# Altium footprint library ic.PcbLib: 68 footprints (part 3 of 5)
Each footprint in its own frame and in the unit in brackets; x right, y up, seen from the top. Pads: shape width x height; smd on the part's side, far side on the other; paste and mask are expansions set on the pad; w line width, h text height; cw(c..) or ccw(c..) is an arc to the next point about the centre after c.
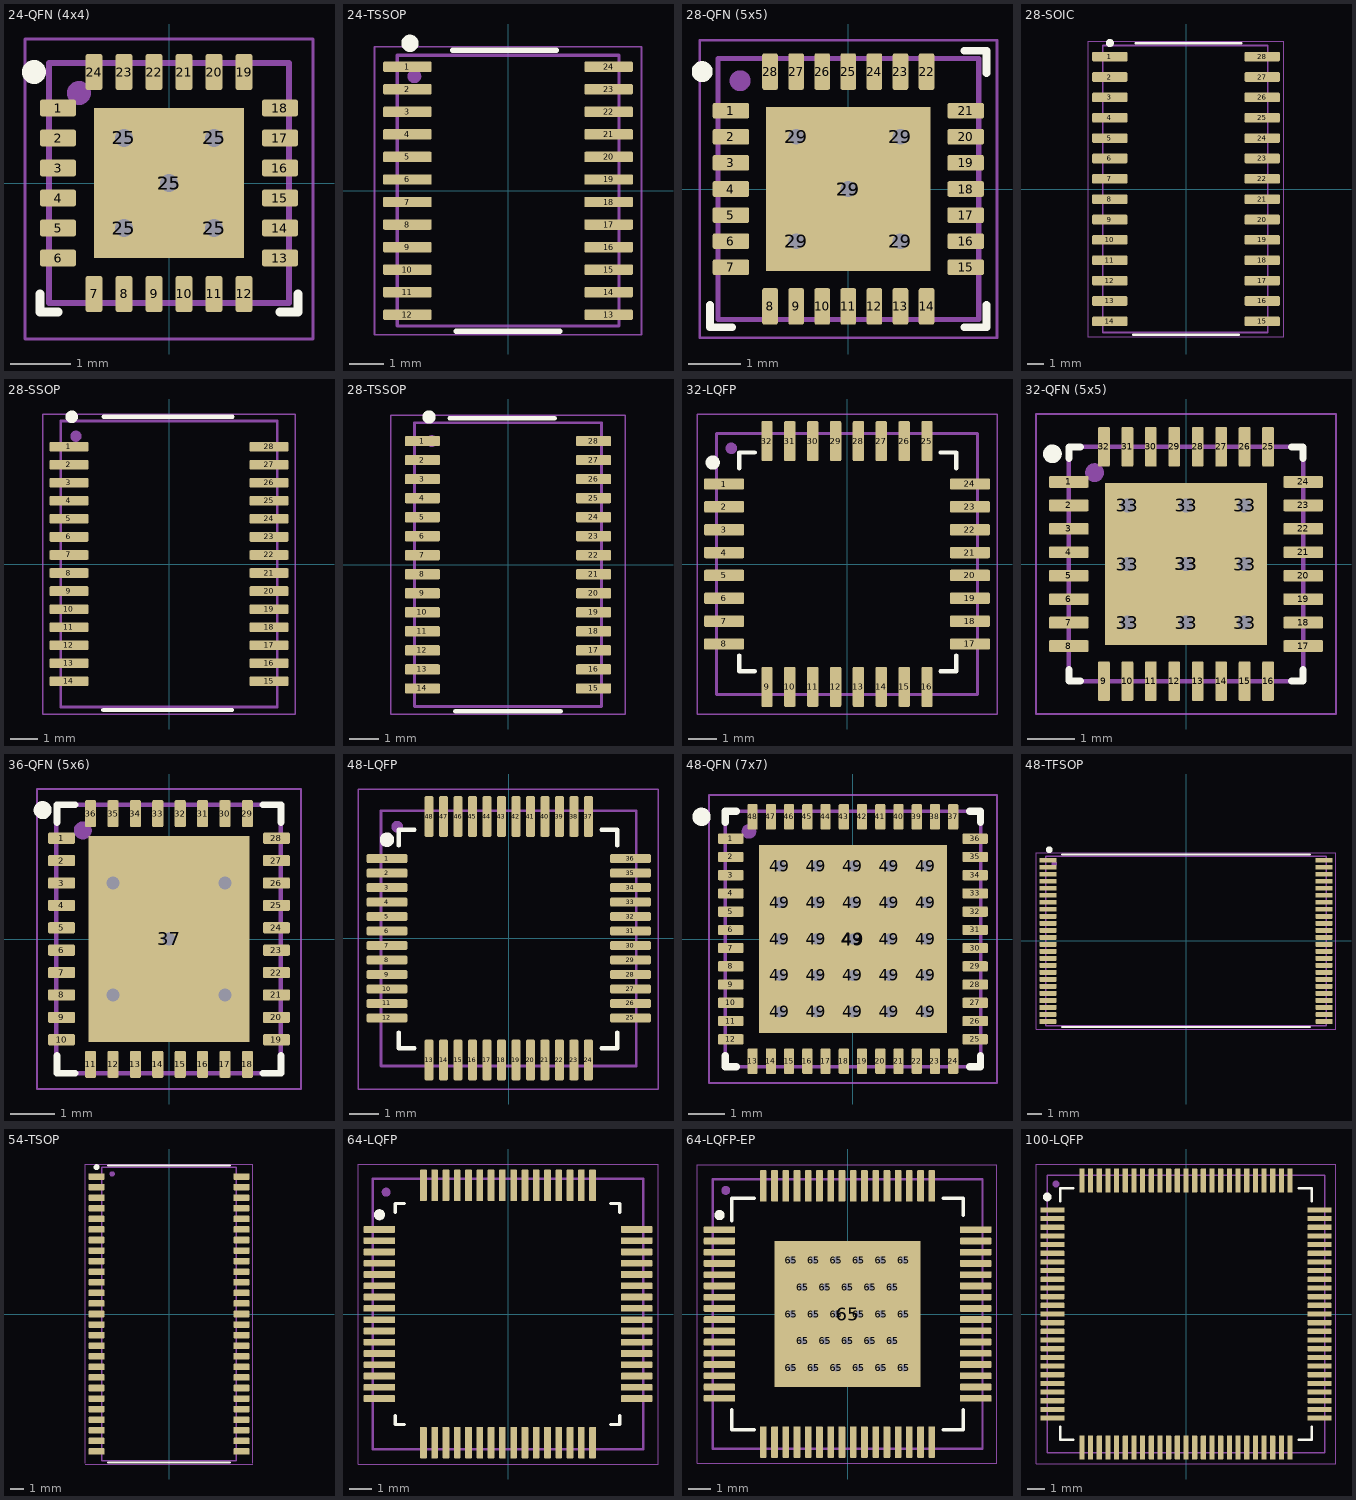
[diagram p2: the footprints below, top view; thin cyan lines are the x and y axes]

## 24-QFN (4x4) [mm]
height 0.75
pads (30):
  rrect25% 0.6x0.28 smd: 1(-1.85,1.25) 2(-1.85,0.75) 3(-1.85,0.25) 4(-1.85,-0.25) 5(-1.85,-0.75) 6(-1.85,-1.25) 13(1.85,-1.25) 14(1.85,-0.75) 15(1.85,-0.25) 16(1.85,0.25) 17(1.85,0.75) 18(1.85,1.25)
  rrect25% 0.28x0.6 smd: 7(-1.25,-1.85) 8(-0.75,-1.85) 9(-0.25,-1.85) 10(0.25,-1.85) 11(0.75,-1.85) 12(1.25,-1.85) 19(1.25,1.85) 20(0.75,1.85) 21(0.25,1.85) 22(-0.25,1.85) 23(-0.75,1.85) 24(-1.25,1.85)
  round 0.6 hole 0.3: 25(-0.75,-0.75) 25(-0.75,0.75) 25(0,0) 25(0.75,-0.75) 25(0.75,0.75)
  rect 2.5x2.5 smd: 25(0,0)
Top Overlay:
  circle w0.2: c-2.25,1.85 r0.1
  lines w0.15: -2.15,-1.85 -2.15,-2.15 -1.85,-2.15 ; 1.85,-2.15 2.15,-2.15 2.15,-1.85
Top Assy:
  circle w0.2: c-1.5,1.5 r0.1
  lines w0.1: -2,-2 -2,2 2,2 2,-2 -2,-2
  text ".Designator" at 0,0 h1
Top Cortyard:
  lines w0.05: -2.4,-2.6 -2.4,2.4 2.4,2.4 2.4,-2.6 -2.4,-2.6
  lines w0.1: -0.5,0 0.5,0 ; 0,-0.5 0,0.5
3D body "24-QFN (4x4 mm).step": height 0.75, standoff 0, extent -2,-2 2,2

## 24-TSSOP [mm]
height 1.2
pads (24):
  rrect25% 1.4x0.3 smd: 1(-2.9,3.575) 2(-2.9,2.925) 3(-2.9,2.275) 4(-2.9,1.625) 5(-2.9,0.975) 6(-2.9,0.325) 7(-2.9,-0.325) 8(-2.9,-0.975) 9(-2.9,-1.625) 10(-2.9,-2.275) 11(-2.9,-2.925) 12(-2.9,-3.575) 13(2.9,-3.575) 14(2.9,-2.925) 15(2.9,-2.275) 16(2.9,-1.625) 17(2.9,-0.975) 18(2.9,-0.325) 19(2.9,0.325) 20(2.9,0.975) 21(2.9,1.625) 22(2.9,2.275) 23(2.9,2.925) 24(2.9,3.575)
Top Overlay:
  circle w0.25: c-2.825,4.25 r0.125
  lines w0.15: -1.6,4.05 1.4,4.05 ; -1.5,-4.05 1.5,-4.05
Top Assy:
  lines w0.1: -3.2,-3.9 -3.2,3.9 3.2,3.9 3.2,-3.9 -3.2,-3.9
  lines w0.2: -2.605,3.332 ccw(c-2.7,3.3) -2.6,3.3
  text ".Designator" at 0,0 h1
Top Cortyard:
  lines w0.05: -3.85,-4.15 -3.85,4.15 3.85,4.15 3.85,-4.15 -3.85,-4.15
3D body "TSSOP24.STEP": height 1.2, standoff 0, extent -3.2,-3.9 3.2,3.9

## 28-QFN (5x5) [mm] "PQFN, 28-Leads, Body 5,00x5,00mm, Pitch 0,50mm, Thermal Pad 3,15x3,15mm, IPC Medium Density"
height 0.9
pads (34):
  rrect25% 0.7x0.3 smd: 1(-2.25,1.5) 2(-2.25,1) 3(-2.25,0.5) 4(-2.25,0) 5(-2.25,-0.5) 6(-2.25,-1) 7(-2.25,-1.5) 15(2.25,-1.5) 16(2.25,-1) 17(2.25,-0.5) 18(2.25,0) 19(2.25,0.5) 20(2.25,1) 21(2.25,1.5)
  rrect25% 0.3x0.7 smd: 8(-1.5,-2.25) 9(-1,-2.25) 10(-0.5,-2.25) 11(0,-2.25) 12(0.5,-2.25) 13(1,-2.25) 14(1.5,-2.25) 22(1.5,2.25) 23(1,2.25) 24(0.5,2.25) 25(0,2.25) 26(-0.5,2.25) 27(-1,2.25) 28(-1.5,2.25)
  round 0.6 hole 0.3: 29(-1,-1) 29(-1,1) 29(0,0) 29(1,-1) 29(1,1)
  rect 3.15x3.15 smd: 29(0,0)
Top Overlay:
  circle w0.2: c-2.8,2.25 r0.1
  lines w0.15: -2.65,-2.225 -2.65,-2.65 -2.225,-2.65 ; 2.225,-2.65 2.65,-2.65 2.65,-2.225 ; 2.225,2.65 2.65,2.65 2.65,2.225
Top Assy:
  circle w0.2: c-2.075,2.075 r0.1
  lines w0.1: -2.5,-2.5 -2.5,2.5 2.5,2.5 2.5,-2.5 -2.5,-2.5
  text ".Designator" at 0,0 h1
Top Cortyard:
  lines w0.05: -2.85,-2.85 2.85,-2.85 2.85,2.85 -2.85,2.85 -2.85,-2.85
3D body "28-QFN, 0.5 mm.step": height 0.9, standoff 0, extent -2.5,-2.5 2.5,2.5

## 28-SOIC [mm] "SOIC, 28-Leads, Body 17,86x7,46mm, Pitch 1,27mm, IPC Medium Density"
height 2.65
pads (28):
  rrect25% 2.2x0.6 smd: 1(-4.75,8.255) 2(-4.75,6.985) 3(-4.75,5.715) 4(-4.75,4.445) 5(-4.75,3.175) 6(-4.75,1.905) 7(-4.75,0.635) 8(-4.75,-0.635) 9(-4.75,-1.905) 10(-4.75,-3.175) 11(-4.75,-4.445) 12(-4.75,-5.715) 13(-4.75,-6.985) 14(-4.75,-8.255) 15(4.75,-8.255) 16(4.75,-6.985) 17(4.75,-5.715) 18(4.75,-4.445) 19(4.75,-3.175) 20(4.75,-1.905) 21(4.75,-0.635) 22(4.75,0.635) 23(4.75,1.905) 24(4.75,3.175) 25(4.75,4.445) 26(4.75,5.715) 27(4.75,6.985) 28(4.75,8.255)
Top Overlay:
  circle w0.25: c-4.75,9.105 r0.125
  lines w0.15: -3.3,-9.1 3.3,-9.1 ; -3.15,9.1 3.45,9.1
Top Assy:
  lines w0.1: -5.2,-8.95 -5.2,8.95 5.1,8.95 5.1,-8.95 -5.2,-8.95
  lines w0.2: -4.527,8.277 ccw(c-4.625,8.255) -4.526,8.267
  text ".Designator" at 0,0 h1
Top Cortyard:
  lines w0.05: -6.1,-9.25 -6.1,9.2 6.1,9.2 6.1,-9.25 ; -6.1,-9.2 6.1,-9.2
3D body "User Library-28-SOIC.STEP": height 2.73, standoff -0.03, extent -5.2,-8.95 5.1,8.95

## 28-SSOP [mm]
pads (28):
  rrect25% 1.4x0.35 smd: 1(-3.6,4.225) 2(-3.6,3.575) 3(-3.6,2.925) 4(-3.6,2.275) 5(-3.6,1.625) 6(-3.6,0.975) 7(-3.6,0.325) 8(-3.6,-0.325) 9(-3.6,-0.975) 10(-3.6,-1.625) 11(-3.6,-2.275) 12(-3.6,-2.925) 13(-3.6,-3.575) 14(-3.6,-4.225) 15(3.6,-4.225) 16(3.6,-3.575) 17(3.6,-2.925) 18(3.6,-2.275) 19(3.6,-1.625) 20(3.6,-0.975) 21(3.6,-0.325) 22(3.6,0.325) 23(3.6,0.975) 24(3.6,1.625) 25(3.6,2.275) 26(3.6,2.925) 27(3.6,3.575) 28(3.6,4.225)
Top Overlay:
  circle w0.254: c-3.5,5.3 r0.1
  lines w0.15: -2.365,-5.25 2.265,-5.25 ; -2.35,5.3 2.28,5.3
Top Assy:
  lines w0.1: -3.9,-5.15 3.9,-5.15 3.9,5.15 -3.9,5.15 -3.9,-5.15
  lines w0.2: -3.255,4.568 cw(c-3.35,4.6) -3.25,4.6
  text ".Designator" at 0,0 h1
Top Cortyard:
  lines w0.05: -4.55,-5.4 -4.55,5.4 4.55,5.4 4.55,-5.4 -4.55,-5.4
3D body "User Library-SSOP-28-1.STEP": height 2.15, standoff 0, extent -3.878,-5.165 3.878,5.165

## 28-TSSOP [mm] "SOP, 28-Leads, Body 9,70x4,40mm, Pitch 0,65mm, IPC Medium Density"
height 2.65
pads (28):
  rrect25% 1.2x0.35 smd: 1(-2.925,4.225) 2(-2.925,3.575) 3(-2.925,2.925) 4(-2.925,2.275) 5(-2.925,1.625) 6(-2.925,0.975) 7(-2.925,0.325) 8(-2.925,-0.325) 9(-2.925,-0.975) 10(-2.925,-1.625) 11(-2.925,-2.275) 12(-2.925,-2.925) 13(-2.925,-3.575) 14(-2.925,-4.225) 15(2.925,-4.225) 16(2.925,-3.575) 17(2.925,-2.925) 18(2.925,-2.275) 19(2.925,-1.625) 20(2.925,-0.975) 21(2.925,-0.325) 22(2.925,0.325) 23(2.925,0.975) 24(2.925,1.625) 25(2.925,2.275) 26(2.925,2.925) 27(2.925,3.575) 28(2.925,4.225)
Top Overlay:
  lines w0.15: -2,5 1.6,5 ; -1.8,-5 1.8,-5
  lines w0.254: -2.603,5.026 cw(c-2.7,5.05) -2.6,5.05
Top Assy:
  lines w0.1: -3.2,-4.85 3.2,-4.85 3.2,4.85 -3.2,4.85 -3.2,-4.85
  lines w0.2: -2.503,4.225 cw(c-2.603,4.225) -2.503,4.233
  text ".Designator" at 0,0 h1
Top Cortyard:
  lines w0.05: -4,-5.1 4,-5.1 4,5.1 -4,5.1 -4,-5.1
3D body "User Library-TSSOP-28.STEP": height 1.2, standoff 0, extent -3.2,-4.85 3.2,4.85

## 32-LQFP [mm] "Generic LQFP-32 case"
height 1.6
pads (32):
  rrect25% 1.4x0.4 smd: 1(-4.3,2.8) 2(-4.3,2) 3(-4.3,1.2) 4(-4.3,0.4) 5(-4.3,-0.4) 6(-4.3,-1.2) 7(-4.3,-2) 8(-4.3,-2.8) 17(4.3,-2.8) 18(4.3,-2) 19(4.3,-1.2) 20(4.3,-0.4) 21(4.3,0.4) 22(4.3,1.2) 23(4.3,2) 24(4.3,2.8)
  rrect25% 0.4x1.4 smd: 9(-2.8,-4.3) 10(-2,-4.3) 11(-1.2,-4.3) 12(-0.4,-4.3) 13(0.4,-4.3) 14(1.2,-4.3) 15(2,-4.3) 16(2.8,-4.3) 25(2.8,4.3) 26(2,4.3) 27(1.2,4.3) 28(0.4,4.3) 29(-0.4,4.3) 30(-1.2,4.3) 31(-2,4.3) 32(-2.8,4.3)
Top Overlay:
  circle w0.25: c-4.7,3.55 r0.125
  lines w0.15: -3.775,-3.2 -3.775,-3.75 -3.225,-3.75 ; -3.775,3.35 -3.775,3.9 -3.225,3.9 ; 3.275,-3.75 3.825,-3.75 3.825,-3.2 ; 3.275,3.9 3.825,3.9 3.825,3.35
Top Assy:
  circle w0.2: c-4.05,4.05 r0.1
  lines w0.1: -4.572,-4.572 4.572,-4.572 4.572,4.572 -4.572,4.572 -4.572,-4.572
  text ".Designator" at 0,0 h1
Top Cortyard:
  lines w0.05: -5.25,-5.25 -5.25,5.25 5.25,5.25 5.25,-5.25 -5.25,-5.25
3D body "User Library-LQFP32-2.STEP": height 1.62, standoff -0.01, extent -4.572,-4.572 4.572,4.572

## 32-QFN (5x5) [mm] "QFN, 32-Leads, Body 5x5mm, Pitch 0.5mm, Thermal Pad 3.45x3.45mm, TI Recommended"
height 1
pads (42):
  rrect25% 0.85x0.25 smd paste-0.025 mask+0.07: 1(-2.5,1.75) 2(-2.5,1.25) 3(-2.5,0.75) 4(-2.5,0.25) 5(-2.5,-0.25) 6(-2.5,-0.75) 7(-2.5,-1.25) 8(-2.5,-1.75) 17(2.5,-1.75) 18(2.5,-1.25) 19(2.5,-0.75) 20(2.5,-0.25) 21(2.5,0.25) 22(2.5,0.75) 23(2.5,1.25) 24(2.5,1.75)
  rrect25% 0.25x0.85 smd paste-0.025 mask+0.07: 9(-1.75,-2.5) 10(-1.25,-2.5) 11(-0.75,-2.5) 12(-0.25,-2.5) 13(0.25,-2.5) 14(0.75,-2.5) 15(1.25,-2.5) 16(1.75,-2.5) 25(1.75,2.5) 26(1.25,2.5) 27(0.75,2.5) 28(0.25,2.5) 29(-0.25,2.5) 30(-0.75,2.5) 31(-1.25,2.5) 32(-1.75,2.5)
  round 0.6 hole 0.3: 33(-1.25,-1.25) 33(-1.25,0) 33(-1.25,1.25) 33(0,-1.25) 33(0,0) 33(0,1.25) 33(1.25,-1.25) 33(1.25,0) 33(1.25,1.25)
  rect 3.45x3.45 smd paste-1.725 mask+0.07: 33(0,0)
Top Overlay:
  circle w0.2: c-2.85,2.35 r0.1
  lines w0.15: -2.5,-2.25 -2.5,-2.5 -2.25,-2.5 ; -2.5,2.25 -2.5,2.5 -2.25,2.5 ; 2.25,-2.5 2.5,-2.5 2.5,-2.25 ; 2.25,2.5 2.5,2.5 2.5,2.25
Top Paste:
  region: -0.15,1.6 -1.6,1.6 -1.6,0.15 -0.15,0.15
  rectangle: 0.15,0.15 1.6,1.6
  rectangle: 0.15,-1.6 1.6,-0.15
  region: -0.15,-0.15 -1.6,-0.15 -1.6,-1.6 -0.15,-1.6
Top Assy:
  circle w0.2: c-1.95,1.95 r0.1
  lines w0.1: 2.501,2.499 2.5,2.5 ; 2.5,2.5 2.5,-2.5 -2.5,-2.5 -2.5,2.5 2.5,2.5
  text ".Designator" at 0,0 h1
Top Cortyard:
  lines w0.05: -3.2,-3.2 -3.2,3.2 3.2,3.2 3.2,-3.2 -3.2,-3.2
3D body "User Library-qfn32-5x5__ _________.STEP": height 0.8, standoff 0, extent -2.52,-2.51 2.5,2.51

## 36-QFN (5x6) [mm] "QFN, 36-Leads, Body 5x6mm, Pitch 0.5mm, Thermal Pad 3.6x4.6mm"
height 1
pads (37):
  rrect25% 0.6x0.25 smd paste-0.025 mask+0.07: 1(-2.4,2.25) 2(-2.4,1.75) 3(-2.4,1.25) 4(-2.4,0.75) 5(-2.4,0.25) 6(-2.4,-0.25) 7(-2.4,-0.75) 8(-2.4,-1.25) 9(-2.4,-1.75) 10(-2.4,-2.25) 19(2.4,-2.25) 20(2.4,-1.75) 21(2.4,-1.25) 22(2.4,-0.75) 23(2.4,-0.25) 24(2.4,0.25) 25(2.4,0.75) 26(2.4,1.25) 27(2.4,1.75) 28(2.4,2.25)
  rrect25% 0.25x0.6 smd paste-0.025 mask+0.07: 11(-1.75,-2.8) 12(-1.25,-2.8) 13(-0.75,-2.8) 14(-0.25,-2.8) 15(0.25,-2.8) 16(0.75,-2.8) 17(1.25,-2.8) 18(1.75,-2.8) 29(1.75,2.8) 30(1.25,2.8) 31(0.75,2.8) 32(0.25,2.8) 33(-0.25,2.8) 34(-0.75,2.8) 35(-1.25,2.8) 36(-1.75,2.8)
  rect 3.6x4.6 smd paste-1.725 mask+0.07: 37(0,0)
via 0,0 diameter 0.6 hole 0.3
via -1.25,-1.25 diameter 0.6 hole 0.3
via 1.25,-1.25 diameter 0.6 hole 0.3
via 1.25,1.25 diameter 0.6 hole 0.3
via -1.25,1.25 diameter 0.6 hole 0.3
Top Overlay:
  circle w0.2: c-2.821,2.878 r0.1
  lines w0.15: -2.5,-2.6 -2.5,-3 -2.1,-3 ; -2.5,2.6 -2.5,3 -2.1,3 ; 2.1,-3 2.5,-3 2.5,-2.6 ; 2.1,3 2.5,3 2.5,2.6
Top Paste:
  region: -0.15,1.6 -1.6,1.6 -1.6,0.15 -0.15,0.15
  rectangle: 0.15,0.15 1.6,1.6
  rectangle: 0.15,-1.6 1.6,-0.15
  region: -0.15,-0.15 -1.6,-0.15 -1.6,-1.6 -0.15,-1.6
Top Assy:
  circle w0.2: c-1.925,2.425 r0.1
  lines w0.1: -2.519,-3 2.501,-3 2.501,3 -2.519,3 -2.519,-3
  text ".Designator" at 0,0 h1
Top Cortyard:
  lines w0.05: -2.95,-3.35 2.95,-3.35 2.95,3.35 -2.95,3.35 -2.95,-3.35
3D body: height 1, standoff 0, extent -2.519,-3 2.501,3

## 48-LQFP [mm] "QFP, 48-Leads, Body 7x7mm, Pitch 0.5mm, IPC Medium Density"
height 1.6
pads (48):
  rrect25% 1.4x0.3 smd: 1(-4.2,2.75) 2(-4.2,2.25) 3(-4.2,1.75) 4(-4.2,1.25) 5(-4.2,0.75) 6(-4.2,0.25) 7(-4.2,-0.25) 8(-4.2,-0.75) 9(-4.2,-1.25) 10(-4.2,-1.75) 11(-4.2,-2.25) 12(-4.2,-2.75) 25(4.2,-2.75) 26(4.2,-2.25) 27(4.2,-1.75) 28(4.2,-1.25) 29(4.2,-0.75) 30(4.2,-0.25) 31(4.2,0.25) 32(4.2,0.75) 33(4.2,1.25) 34(4.2,1.75) 35(4.2,2.25) 36(4.2,2.75)
  rrect25% 0.3x1.4 smd: 13(-2.75,-4.2) 14(-2.25,-4.2) 15(-1.75,-4.2) 16(-1.25,-4.2) 17(-0.75,-4.2) 18(-0.25,-4.2) 19(0.25,-4.2) 20(0.75,-4.2) 21(1.25,-4.2) 22(1.75,-4.2) 23(2.25,-4.2) 24(2.75,-4.2) 37(2.75,4.2) 38(2.25,4.2) 39(1.75,4.2) 40(1.25,4.2) 41(0.75,4.2) 42(0.25,4.2) 43(-0.25,4.2) 44(-0.75,4.2) 45(-1.25,4.2) 46(-1.75,4.2) 47(-2.25,4.2) 48(-2.75,4.2)
Top Overlay:
  circle w0.25: c-4.2,3.4 r0.125
  lines w0.15: -3.8,-3.25 -3.8,-3.8 -3.25,-3.8 ; -3.8,3.2 -3.8,3.75 -3.25,3.75 ; 3.2,-3.8 3.75,-3.8 3.75,-3.25 ; 3.2,3.75 3.75,3.75 3.75,3.2
Top Assy:
  circle w0.2: c-3.85,3.85 r0.1
  lines w0.1: -4.4,-4.4 -4.4,4.4 4.4,4.4 4.4,-4.4 -4.4,-4.4
  text ".Designator" at 0,0 h1
Top Cortyard:
  lines w0.05: -5.2,-5.2 5.15,-5.2 5.15,5.15 -5.2,5.15 -5.2,-5.2
3D body "User Library-LQFP48-0_5.STEP": height 1.55, standoff -0.02, extent -4.386,-4.386 4.386,4.386

## 48-QFN (7x7) [mm]
height 0.75
pads (74):
  rrect25% 0.7x0.28 smd mask+0.05: 1(-3.35,2.75) 2(-3.35,2.25) 3(-3.35,1.75) 4(-3.35,1.25) 5(-3.35,0.75) 6(-3.35,0.25) 7(-3.35,-0.25) 8(-3.35,-0.75) 9(-3.35,-1.25) 10(-3.35,-1.75) 11(-3.35,-2.25) 12(-3.35,-2.75) 25(3.35,-2.75) 26(3.35,-2.25) 27(3.35,-1.75) 28(3.35,-1.25) 29(3.35,-0.75) 30(3.35,-0.25) 31(3.35,0.25) 32(3.35,0.75) 33(3.35,1.25) 34(3.35,1.75) 35(3.35,2.25) 36(3.35,2.75)
  rrect25% 0.28x0.7 smd mask+0.05: 13(-2.75,-3.35) 14(-2.25,-3.35) 15(-1.75,-3.35) 16(-1.25,-3.35) 17(-0.75,-3.35) 18(-0.25,-3.35) 19(0.25,-3.35) 20(0.75,-3.35) 21(1.25,-3.35) 22(1.75,-3.35) 23(2.25,-3.35) 24(2.75,-3.35) 37(2.75,3.35) 38(2.25,3.35) 39(1.75,3.35) 40(1.25,3.35) 41(0.75,3.35) 42(0.25,3.35) 43(-0.25,3.35) 44(-0.75,3.35) 45(-1.25,3.35) 46(-1.75,3.35) 47(-2.25,3.35) 48(-2.75,3.35)
  round 0.7 hole 0.3: 49(-2,-2) 49(-2,-1) 49(-2,0) 49(-2,1) 49(-2,2) 49(-1,-2) 49(-1,-1) 49(-1,0) 49(-1,1) 49(-1,2) 49(0,-2) 49(0,-1) 49(0,0) 49(0,1) 49(0,2) 49(1,-2) 49(1,-1) 49(1,0) 49(1,1) 49(1,2) 49(2,-2) 49(2,-1) 49(2,0) 49(2,1) 49(2,2)
  rect 5.15x5.15 smd mask+0.05: 49(0,0)
Top Overlay:
  circle w0.25: c-4.15,3.35 r0.125
  lines w0.2: -3.5,-3.2 -3.5,-3.5 -3.2,-3.5 ; -3.5,3.2 -3.5,3.5 -3.2,3.5 ; 3.2,-3.5 3.5,-3.5 3.5,-3.2 ; 3.2,3.5 3.5,3.5 3.5,3.2
Top Assy:
  circle w0.2: c-2.85,2.95 r0.1
  lines w0.1: -3.5,-3.5 3.5,-3.5 3.5,3.5 -3.5,3.5 -3.5,-3.5
  text ".Designator" at 0,0 h1
Top Cortyard:
  lines w0.05: -3.95,-3.95 3.95,-3.95 3.95,3.95 -3.95,3.95 -3.95,-3.95
3D body "User Library-QFN48_7x7.STEP": height 0.78, standoff -0.02, extent -3.51,-3.51 3.51,3.51

## 48-TFSOP [mm] "TSSOP, 48-Leads, Body 12,00x18,40mm, Pitch 0,50mm, IPC Medium Density"
height 1.2
pads (48):
  rrect25% 1.2x0.35 smd: 1(-9.85,5.75) 2(-9.85,5.25) 3(-9.85,4.75) 4(-9.85,4.25) 5(-9.85,3.75) 6(-9.85,3.25) 7(-9.85,2.75) 8(-9.85,2.25) 9(-9.85,1.75) 10(-9.85,1.25) 11(-9.85,0.75) 12(-9.85,0.25) 13(-9.85,-0.25) 14(-9.85,-0.75) 15(-9.85,-1.25) 16(-9.85,-1.75) 17(-9.85,-2.25) 18(-9.85,-2.75) 19(-9.85,-3.25) 20(-9.85,-3.75) 21(-9.85,-4.25) 22(-9.85,-4.75) 23(-9.85,-5.25) 24(-9.85,-5.75) 25(9.85,-5.75) 26(9.85,-5.25) 27(9.85,-4.75) 28(9.85,-4.25) 29(9.85,-3.75) 30(9.85,-3.25) 31(9.85,-2.75) 32(9.85,-2.25) 33(9.85,-1.75) 34(9.85,-1.25) 35(9.85,-0.75) 36(9.85,-0.25) 37(9.85,0.25) 38(9.85,0.75) 39(9.85,1.25) 40(9.85,1.75) 41(9.85,2.25) 42(9.85,2.75) 43(9.85,3.25) 44(9.85,3.75) 45(9.85,4.25) 46(9.85,4.75) 47(9.85,5.25) 48(9.85,5.75)
Top Overlay:
  lines w0.15: -8.85,-6.15 8.85,-6.15 ; -8.85,6.15 8.85,6.15
  lines w0.254: -9.644,6.535 ccw(c-9.75,6.5) -9.64,6.522
Top Assy:
  circle w0.2: c-9.4,5.5 r0.1
  lines w0.1: -10,-6.05 -10,6.05 10,6.05 10,-6.05 -10,-6.05
  text ".Designator" at 0,0 h1
Top Cortyard:
  lines w0.05: -10.7,-6.3 -10.7,6.3 10.7,6.3 10.7,-6.3 -10.7,-6.3
3D body "48-TFSOP.step": height 1.2, standoff 0, extent -10,-6.05 10,6.05

## 54-TSOP [mm] "TSSOP, 48-Leads, Body 12,00x18,40mm, Pitch 0,50mm, IPC Medium Density"
height 1.2
pads (54):
  rrect25% 1.2x0.5 smd: 1(-5.48,10.4) 2(-5.48,9.6) 3(-5.48,8.8) 4(-5.48,8) 5(-5.48,7.2) 6(-5.48,6.4) 7(-5.48,5.6) 8(-5.48,4.8) 9(-5.48,4) 10(-5.48,3.2) 11(-5.48,2.4) 12(-5.48,1.6) 13(-5.48,0.8) 14(-5.48,0) 15(-5.48,-0.8) 16(-5.48,-1.6) 17(-5.48,-2.4) 18(-5.48,-3.2) 19(-5.48,-4) 20(-5.48,-4.8) 21(-5.48,-5.6) 22(-5.48,-6.4) 23(-5.48,-7.2) 24(-5.48,-8) 25(-5.48,-8.8) 26(-5.48,-9.6) 27(-5.48,-10.4) 28(5.48,-10.4) 29(5.48,-9.6) 30(5.48,-8.8) 31(5.48,-8) 32(5.48,-7.2) 33(5.48,-6.4) 34(5.48,-5.6) 35(5.48,-4.8) 36(5.48,-4) 37(5.48,-3.2) 38(5.48,-2.4) 39(5.48,-1.6) 40(5.48,-0.8) 41(5.48,0) 42(5.48,0.8) 43(5.48,1.6) 44(5.48,2.4) 45(5.48,3.2) 46(5.48,4) 47(5.48,4.8) 48(5.48,5.6) 49(5.48,6.4) 50(5.48,7.2) 51(5.48,8) 52(5.48,8.8) 53(5.48,9.6) 54(5.48,10.4)
Top Overlay:
  circle w0.254: c-5.48,11.11 r0.1
  lines w0.15: -4.6,-11.25 4.6,-11.25 ; -4.6,11.25 4.6,11.25
Top Assy:
  circle w0.2: c-4.3,10.6 r0.1
  lines w0.1: -5.08,-11.1 5.08,-11.1 5.08,11.1 -5.08,11.1 -5.08,-11.1
  text ".Designator" at 0,0 h1
Top Cortyard:
  lines w0.05: -6.35,-11.35 6.35,-11.35 ; -6.35,-11.3 -6.35,11.35 6.35,11.35 6.35,-11.3
3D body: height 1.2, standoff 0, extent -5.08,-11.11 5.08,11.1

## 64-LQFP [mm] "Thin QFP, 64-Leads, Body 10x10mm, Pitch 0.5mm, IPC Medium Density"
height 1.6
pads (65):
  rrect25% 1.4x0.3 smd: 1(-5.7,3.75) 2(-5.7,3.25) 3(-5.7,2.75) 4(-5.7,2.25) 5(-5.7,1.75) 6(-5.7,1.25) 7(-5.7,0.75) 8(-5.7,0.25) 9(-5.7,-0.25) 10(-5.7,-0.75) 11(-5.7,-1.25) 12(-5.7,-1.75) 13(-5.7,-2.25) 14(-5.7,-2.75) 15(-5.7,-3.25) 16(-5.7,-3.75) 33(5.7,-3.75) 34(5.7,-3.25) 35(5.7,-2.75) 36(5.7,-2.25) 37(5.7,-1.75) 38(5.7,-1.25) 39(5.7,-0.75) 40(5.7,-0.25) 41(5.7,0.25) 42(5.7,0.75) 43(5.7,1.25) 44(5.7,1.75) 45(5.7,2.25) 46(5.7,2.75) 47(5.7,3.25) 48(5.7,3.75)
  rrect25% 0.3x1.4 smd: 17(-3.75,-5.7) 18(-3.25,-5.7) 19(-2.75,-5.7) 20(-2.25,-5.7) 21(-1.75,-5.7) 22(-1.25,-5.7) 23(-0.75,-5.7) 24(-0.25,-5.7) 25(0.25,-5.7) 26(0.75,-5.7) 27(1.25,-5.7) 28(1.75,-5.7) 29(2.25,-5.7) 30(2.75,-5.7) 31(3.25,-5.7) 32(3.75,-5.7) 49(3.75,5.7) 50(3.25,5.7) 51(2.75,5.7) 52(2.25,5.7) 53(1.75,5.7) 54(1.25,5.7) 55(0.75,5.7) 56(0.25,5.7) 57(-0.25,5.7) 58(-0.75,5.7) 59(-1.25,5.7) 60(-1.75,5.7) 61(-2.25,5.7) 62(-2.75,5.7) 63(-3.25,5.7) 64(-3.75,5.7)
  round 0.5 on Top Overlay: ""(-5.7,4.4)
Top Overlay:
  lines w0.15: -5,-4.5 -5,-4.9 -4.6,-4.9 ; -5,4.5 -5,4.9 -4.6,4.9 ; 4.55,-4.9 4.95,-4.9 4.95,-4.5 ; 4.55,4.9 4.95,4.9 4.95,4.5
Top Assy:
  circle w0.2: c-5.4,5.4 r0.1
  lines w0.1: -6,-6 -6,6 6,6 6,-6 -6,-6
  text ".Designator" at 0,0 h1
Top Cortyard:
  lines w0.05: -6.65,-6.65 6.65,-6.65 6.65,6.65 -6.65,6.65 -6.65,-6.65
3D body "LQFP-64.STEP": height 1.5, standoff 0.02, extent -6,-6 6,6

## 64-LQFP-EP [mm] "Thin QFP, 64-Leads, Body 10x10mm, Pitch 0.5mm, IPC Medium Density"
height 1.6
pads (93):
  rrect25% 1.4x0.3 smd: 1(-5.7,3.75) 2(-5.7,3.25) 3(-5.7,2.75) 4(-5.7,2.25) 5(-5.7,1.75) 6(-5.7,1.25) 7(-5.7,0.75) 8(-5.7,0.25) 9(-5.7,-0.25) 10(-5.7,-0.75) 11(-5.7,-1.25) 12(-5.7,-1.75) 13(-5.7,-2.25) 14(-5.7,-2.75) 15(-5.7,-3.25) 16(-5.7,-3.75) 33(5.7,-3.75) 34(5.7,-3.25) 35(5.7,-2.75) 36(5.7,-2.25) 37(5.7,-1.75) 38(5.7,-1.25) 39(5.7,-0.75) 40(5.7,-0.25) 41(5.7,0.25) 42(5.7,0.75) 43(5.7,1.25) 44(5.7,1.75) 45(5.7,2.25) 46(5.7,2.75) 47(5.7,3.25) 48(5.7,3.75)
  rrect25% 0.3x1.4 smd: 17(-3.75,-5.7) 18(-3.25,-5.7) 19(-2.75,-5.7) 20(-2.25,-5.7) 21(-1.75,-5.7) 22(-1.25,-5.7) 23(-0.75,-5.7) 24(-0.25,-5.7) 25(0.25,-5.7) 26(0.75,-5.7) 27(1.25,-5.7) 28(1.75,-5.7) 29(2.25,-5.7) 30(2.75,-5.7) 31(3.25,-5.7) 32(3.75,-5.7) 49(3.75,5.7) 50(3.25,5.7) 51(2.75,5.7) 52(2.25,5.7) 53(1.75,5.7) 54(1.25,5.7) 55(0.75,5.7) 56(0.25,5.7) 57(-0.25,5.7) 58(-0.75,5.7) 59(-1.25,5.7) 60(-1.75,5.7) 61(-2.25,5.7) 62(-2.75,5.7) 63(-3.25,5.7) 64(-3.75,5.7)
  round 0.7 hole 0.3: 65(-2.5,-2.4) 65(-2.5,0) 65(-2.5,2.4) 65(-2,-1.2) 65(-2,1.2) 65(-1.5,-2.4) 65(-1.5,0) 65(-1.5,2.4) 65(-1,-1.2) 65(-1,1.2) 65(-0.5,-2.4) 65(-0.5,0) 65(-0.5,2.4) 65(0,-1.2) 65(0,1.2) 65(0.5,-2.4) 65(0.5,0) 65(0.5,2.4) 65(1,-1.2) 65(1,1.2) 65(1.5,-2.4) 65(1.5,0) 65(1.5,2.4) 65(2,-1.2) 65(2,1.2) 65(2.5,-2.4) 65(2.5,0) 65(2.5,2.4)
  rect 6.5x6.5 smd: 65(0,0)
Top Overlay:
  circle w0.254: c-5.7,4.4 r0.1
  lines w0.15: -5.15,-4.25 -5.15,-5.15 -4.15,-5.15 ; -5.15,4.15 -5.15,5.15 -4.15,5.15 ; 4.25,-5.15 5.15,-5.15 5.15,-4.25 ; 4.25,5.15 5.15,5.15 5.15,4.4
Top Assy:
  lines w0.1: -6,-6 -6,6 6,6 6,-6 -6,-6
  lines w0.2: -5.331,5.455 cw(c-5.421,5.5) -5.321,5.5
  text ".Designator" at 0,0 h1
Top Cortyard:
  lines w0.05: -6.7,-6.65 -6.7,6.65 6.65,6.65 6.65,-6.65 -6.7,-6.65
3D body "LQFP-64.STEP": height 1.5, standoff 0.02, extent -6,-6 6,6

## 100-LQFP [mm] "Thin QFP, 100-Leads, Body 14x14mm, Pitch 0.5mm, IPC Medium Density"
height 1.6
pads (100):
  rrect25% 1.4x0.3 smd: 1(-7.7,6) 2(-7.7,5.5) 3(-7.7,5) 4(-7.7,4.5) 5(-7.7,4) 6(-7.7,3.5) 7(-7.7,3) 8(-7.7,2.5) 9(-7.7,2) 10(-7.7,1.5) 11(-7.7,1) 12(-7.7,0.5) 13(-7.7,0) 14(-7.7,-0.5) 15(-7.7,-1) 16(-7.7,-1.5) 17(-7.7,-2) 18(-7.7,-2.5) 19(-7.7,-3) 20(-7.7,-3.5) 21(-7.7,-4) 22(-7.7,-4.5) 23(-7.7,-5) 24(-7.7,-5.5) 25(-7.7,-6) 51(7.7,-6) 52(7.7,-5.5) 53(7.7,-5) 54(7.7,-4.5) 55(7.7,-4) 56(7.7,-3.5) 57(7.7,-3) 58(7.7,-2.5) 59(7.7,-2) 60(7.7,-1.5) 61(7.7,-1) 62(7.7,-0.5) 63(7.7,0) 64(7.7,0.5) 65(7.7,1) 66(7.7,1.5) 67(7.7,2) 68(7.7,2.5) 69(7.7,3) 70(7.7,3.5) 71(7.7,4) 72(7.7,4.5) 73(7.7,5) 74(7.7,5.5) 75(7.7,6)
  rrect25% 0.3x1.4 smd: 26(-6,-7.7) 27(-5.5,-7.7) 28(-5,-7.7) 29(-4.5,-7.7) 30(-4,-7.7) 31(-3.5,-7.7) 32(-3,-7.7) 33(-2.5,-7.7) 34(-2,-7.7) 35(-1.5,-7.7) 36(-1,-7.7) 37(-0.5,-7.7) 38(0,-7.7) 39(0.5,-7.7) 40(1,-7.7) 41(1.5,-7.7) 42(2,-7.7) 43(2.5,-7.7) 44(3,-7.7) 45(3.5,-7.7) 46(4,-7.7) 47(4.5,-7.7) 48(5,-7.7) 49(5.5,-7.7) 50(6,-7.7) 76(6,7.7) 77(5.5,7.7) 78(5,7.7) 79(4.5,7.7) 80(4,7.7) 81(3.5,7.7) 82(3,7.7) 83(2.5,7.7) 84(2,7.7) 85(1.5,7.7) 86(1,7.7) 87(0.5,7.7) 88(0,7.7) 89(-0.5,7.7) 90(-1,7.7) 91(-1.5,7.7) 92(-2,7.7) 93(-2.5,7.7) 94(-3,7.7) 95(-3.5,7.7) 96(-4,7.7) 97(-4.5,7.7) 98(-5,7.7) 99(-5.5,7.7) 100(-6,7.7)
Top Overlay:
  circle w0.3: c-8,6.75 r0.1
  lines w0.15: -7.25,-6.5 -7.25,-7.25 -6.5,-7.25 ; -7.25,6.5 -7.25,7.25 -6.5,7.25 ; 6.5,-7.25 7.25,-7.25 7.25,-6.5 ; 6.5,7.25 7.25,7.25 7.25,6.5
Top Assy:
  circle w0.2: c-7.5,7.5 r0.1
  lines w0.1: -8,-8 8,-8 8,8 -8,8 -8,-8
  text ".Designator" at 0,0 h1
Top Cortyard:
  lines w0.05: -6.4,8.65 6.4,8.65 8.65,8.65 8.65,6.4 8.65,-6.4 8.65,-8.65 6.4,-8.65 -6.4,-8.65 -8.65,-8.65 -8.65,-6.4 -8.65,6.4 -8.65,8.65 -6.35,8.65
3D body "User Library-lqfp100-1.STEP": height 1.5, standoff 0.02, extent -8,-7.994 8,8.006